# Altium footprint library ic.PcbLib: 106 footprints (part 3 of 7)
Each footprint in its own frame and in the unit in brackets; x right, y up, seen from the top. Pads: shape width x height; smd on the part's side, far side on the other; paste and mask are expansions set on the pad; w line width, h text height; cw(c..) or ccw(c..) is an arc to the next point about the centre after c.
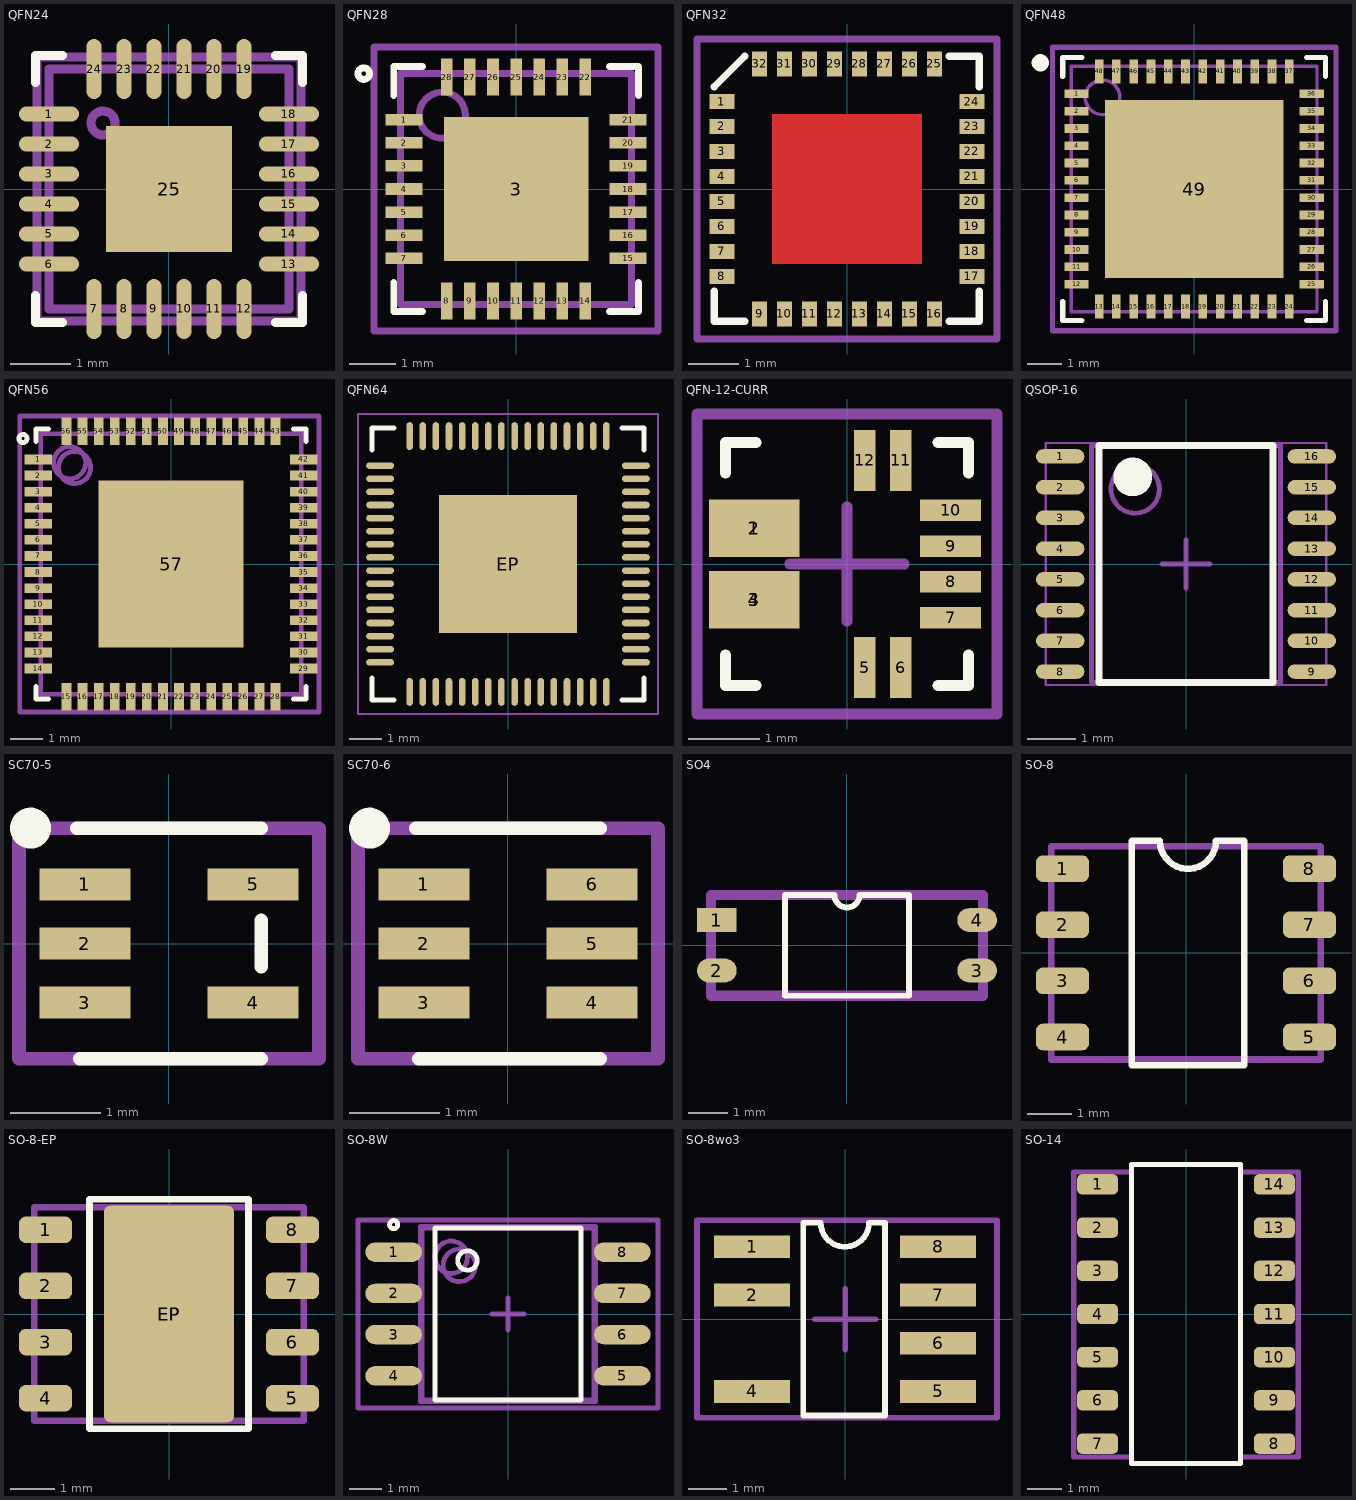
[diagram p2: the footprints below, top view; thin cyan lines are the x and y axes]

## QFN24 [mm] "QFN, 24-Leads, Body 4x4mm, Pitch 0.5mm, Thermal Pad 2.1x2.1mm, IPC Low Density"
height 1
pads (25):
  oval 1x0.25 smd: 1(-2,1.25) 2(-2,0.75) 3(-2,0.25) 4(-2,-0.25) 5(-2,-0.75) 6(-2,-1.25) 13(2,-1.25) 14(2,-0.75) 15(2,-0.25) 16(2,0.25) 17(2,0.75) 18(2,1.25)
  oval 0.25x1 smd: 7(-1.25,-2) 8(-0.75,-2) 9(-0.25,-2) 10(0.25,-2) 11(0.75,-2) 12(1.25,-2) 19(1.25,2) 20(0.75,2) 21(0.25,2) 22(-0.25,2) 23(-0.75,2) 24(-1.25,2)
  rect 2.1x2.1 smd: 25(0,0)
Top Overlay:
  lines w0.15: -2.225,-1.775 -2.225,-2.225 -1.775,-2.225 ; -2.225,1.775 -2.225,2.225 -1.775,2.225 ; 1.775,-2.225 2.225,-2.225 2.225,-1.775 ; 1.775,2.225 2.225,2.225 2.225,1.775
  text "." at -2.845,2.057 h0.1
Top Courtyard:
  lines w0.15: -2,-2 2,-2 2,2 -2,2 -2,-2
Mechanical 29:
  circle w0.15: c-1.1,1.1 r0.2
  lines w0.15: -2.2,-2.2 -2.2,2.2 2.2,2.2 2.2,-2.2 -2.2,-2.2
  text ".Designator" at -2,-0.4 h1
3D body "User Library-LFCSP-24.step": height 0.83, standoff -0.02, extent -2,-2 2,2

## QFN28 [mm] "QFN, 28-Leads, Body 5,00x5,00mm, Pitch 0,50mm, Thermal Pad, IPC Medium Density"
height 1
pads (29):
  rect 0.8x0.25 smd: 1(-2.425,1.5) 2(-2.425,1) 3(-2.425,0.5) 4(-2.425,0) 5(-2.425,-0.5) 6(-2.425,-1) 7(-2.425,-1.5) 15(2.425,-1.5) 16(2.425,-1) 17(2.425,-0.5) 18(2.425,0) 19(2.425,0.5) 20(2.425,1) 21(2.425,1.5)
  rect 3.13x3.13 smd: 3(0,0)
  rect 0.25x0.8 smd: 8(-1.5,-2.425) 9(-1,-2.425) 10(-0.5,-2.425) 11(0,-2.425) 12(0.5,-2.425) 13(1,-2.425) 14(1.5,-2.425) 22(1.5,2.425) 23(1,2.425) 24(0.5,2.425) 25(0,2.425) 26(-0.5,2.425) 27(-1,2.425) 28(-1.5,2.425)
Top Overlay:
  circle w0.15: c-3.3,2.5 r0.125
  lines w0.15: -2.65,-2.025 -2.65,-2.65 -2.025,-2.65 ; -2.65,2.025 -2.65,2.65 -2.025,2.65 ; 2.025,-2.65 2.65,-2.65 2.65,-2.025 ; 2.025,2.65 2.65,2.65 2.65,2.025
Top Solder:
  rectangle: -1.3,1.1 -0.7,1.4
  rectangle: -1.3,0.6 -0.7,0.9
  rectangle: -1.3,0.1 -0.7,0.4
  rectangle: -1.3,-0.4 -0.7,-0.1
  rectangle: -1.3,-0.9 -0.7,-0.6
  rectangle: -1.3,-1.4 -0.7,-1.1
  rectangle: -0.3,-1.4 0.3,-1.1
  rectangle: -0.3,-0.9 0.3,-0.6
  rectangle: -0.3,-0.4 0.3,-0.1
  rectangle: -0.3,0.1 0.3,0.4
  rectangle: -0.3,0.6 0.3,0.9
  rectangle: -0.3,1.1 0.3,1.4
  rectangle: 0.7,-1.4 1.3,-1.1
  rectangle: 0.7,-0.9 1.3,-0.6
  rectangle: 0.7,-0.4 1.3,-0.1
  rectangle: 0.7,0.1 1.3,0.4
  rectangle: 0.7,0.6 1.3,0.9
  rectangle: 0.7,1.1 1.3,1.4
Top Courtyard:
  lines w0.15: -0.5,0 0.5,0 ; 0,-0.5 0,0.5 ; -3.075,-3.075 3.075,-3.075 3.075,3.075 -3.075,3.075 -3.075,-3.075
Mechanical 13:
  circle w0.15: c-1.6,1.6 r0.5
  lines w0.15: -2.5,-2.5 2.5,-2.5 2.5,2.5 -2.5,2.5 -2.5,-2.5
Mechanical 29:
  circle w0.15: c-1.6,1.6 r0.5
  lines w0.15: -2.5,-2.5 -2.5,2.5 2.5,2.5 2.5,-2.5 -2.5,-2.5
  text ".Designator" at -2.2,-0.5 h1
3D body "QFN-28.step": height 1, standoff 0, extent -2.52,-2.52 2.52,2.52

## QFN32 [mm]
pads (32):
  rect 0.5x0.3 smd: 1(-2.5,1.75) 2(-2.5,1.25) 3(-2.5,0.75) 4(-2.5,0.25) 5(-2.5,-0.25) 6(-2.5,-0.75) 7(-2.5,-1.25) 8(-2.5,-1.75) 17(2.5,-1.75) 18(2.5,-1.25) 19(2.5,-0.75) 20(2.5,-0.25) 21(2.5,0.25) 22(2.5,0.75) 23(2.5,1.25) 24(2.5,1.75)
  rect 0.3x0.5 smd: 9(-1.75,-2.5) 10(-1.25,-2.5) 11(-0.75,-2.5) 12(-0.25,-2.5) 13(0.25,-2.5) 14(0.75,-2.5) 15(1.25,-2.5) 16(1.75,-2.5) 25(1.75,2.5) 26(1.25,2.5) 27(0.75,2.5) 28(0.25,2.5) 29(-0.25,2.5) 30(-0.75,2.5) 31(-1.25,2.5) 32(-1.75,2.5)
Top Layer:
  rectangle: -1.5,-1.5 1.5,1.5
Top Overlay:
  lines w0.15: -2.65,-2.05 -2.65,-2.65 -2.05,-2.65 ; -2.65,2.05 -2.05,2.65 ; 2.05,-2.65 2.65,-2.65 2.65,-2.05 ; 2.05,2.65 2.65,2.65 2.65,2.05
  text "." at -2.675,2.65 h0.1
Top Courtyard:
  lines w0.15: -0.8,0 0,0 ; 0,-0.8 0,0 ; 0,0.8 0,0 ; 0.8,0 0,0 ; -3,-3 -3,3 3,3 3,-3 -3,-3

## QFN48 [mm] "QFN, 48-Leads, Body 7,00x7,00mm, Pitch 0,50mm, Thermal Pad 5,15x5,15mm, IPC Medium Density"
height 0.75
pads (49):
  rect 0.7x0.25 smd: 1(-3.4,2.75) 2(-3.4,2.25) 3(-3.4,1.75) 4(-3.4,1.25) 5(-3.4,0.75) 6(-3.4,0.25) 7(-3.4,-0.25) 8(-3.4,-0.75) 9(-3.4,-1.25) 10(-3.4,-1.75) 11(-3.4,-2.25) 12(-3.4,-2.75) 25(3.4,-2.75) 26(3.4,-2.25) 27(3.4,-1.75) 28(3.4,-1.25) 29(3.4,-0.75) 30(3.4,-0.25) 31(3.4,0.25) 32(3.4,0.75) 33(3.4,1.25) 34(3.4,1.75) 35(3.4,2.25) 36(3.4,2.75)
  rect 0.25x0.7 smd: 13(-2.75,-3.4) 14(-2.25,-3.4) 15(-1.75,-3.4) 16(-1.25,-3.4) 17(-0.75,-3.4) 18(-0.25,-3.4) 19(0.25,-3.4) 20(0.75,-3.4) 21(1.25,-3.4) 22(1.75,-3.4) 23(2.25,-3.4) 24(2.75,-3.4) 37(2.75,3.4) 38(2.25,3.4) 39(1.75,3.4) 40(1.25,3.4) 41(0.75,3.4) 42(0.25,3.4) 43(-0.25,3.4) 44(-0.75,3.4) 45(-1.25,3.4) 46(-1.75,3.4) 47(-2.25,3.4) 48(-2.75,3.4)
  rect 5.15x5.15 smd: 49(0,0)
Top Overlay:
  circle w0.25: c-4.45,3.65 r0.125
  lines w0.15: -3.8,-3.25 -3.8,-3.8 -3.25,-3.8 ; -3.8,3.25 -3.8,3.8 -3.25,3.8 ; 3.25,-3.8 3.8,-3.8 3.8,-3.25 ; 3.25,3.8 3.8,3.8 3.8,3.25
Top Courtyard:
  lines w0.15: -0.5,0 0.5,0 ; 0,-0.5 0,0.5 ; -4.1,-4.1 -4.1,4.1 4.1,4.1 4.1,-4.1 -4.1,-4.1
Mechanical 13:
  circle w0.1: c-2.65,2.65 r0.5
  lines w0.1: -3.55,-3.55 -3.55,3.55 3.55,3.55 3.55,-3.55 -3.55,-3.55
3D body "QFN48.step": height 0.75, standoff 0, extent -3.6,-3.6 3.6,3.6

## QFN56 [mm] "QFN, 56-Leads, Body 8,00x8,00mm, Pitch 0,50mm, Thermal Pad 4,50x5,20mm, IPC Medium Density"
height 1
pads (57):
  rect 0.85x0.3 smd: 1(-4.125,3.25) 2(-4.125,2.75) 3(-4.125,2.25) 4(-4.125,1.75) 5(-4.125,1.25) 6(-4.125,0.75) 7(-4.125,0.25) 8(-4.125,-0.25) 9(-4.125,-0.75) 10(-4.125,-1.25) 11(-4.125,-1.75) 12(-4.125,-2.25) 13(-4.125,-2.75) 14(-4.125,-3.25) 29(4.125,-3.25) 30(4.125,-2.75) 31(4.125,-2.25) 32(4.125,-1.75) 33(4.125,-1.25) 34(4.125,-0.75) 35(4.125,-0.25) 36(4.125,0.25) 37(4.125,0.75) 38(4.125,1.25) 39(4.125,1.75) 40(4.125,2.25) 41(4.125,2.75) 42(4.125,3.25)
  rect 0.3x0.85 smd: 15(-3.25,-4.125) 16(-2.75,-4.125) 17(-2.25,-4.125) 18(-1.75,-4.125) 19(-1.25,-4.125) 20(-0.75,-4.125) 21(-0.25,-4.125) 22(0.25,-4.125) 23(0.75,-4.125) 24(1.25,-4.125) 25(1.75,-4.125) 26(2.25,-4.125) 27(2.75,-4.125) 28(3.25,-4.125) 43(3.25,4.125) 44(2.75,4.125) 45(2.25,4.125) 46(1.75,4.125) 47(1.25,4.125) 48(0.75,4.125) 49(0.25,4.125) 50(-0.25,4.125) 51(-0.75,4.125) 52(-1.25,4.125) 53(-1.75,4.125) 54(-2.25,4.125) 55(-2.75,4.125) 56(-3.25,4.125)
  rect 4.5x5.2 smd: 57(0,0)
Top Overlay:
  circle w0.15: c-4.6,3.9 r0.125
  lines w0.15: -4.2,-3.8 -4.2,-4.2 -3.8,-4.2 ; -4.2,3.8 -4.2,4.2 -3.8,4.2 ; 3.8,-4.2 4.2,-4.2 4.2,-3.8 ; 3.8,4.2 4.2,4.2 4.2,3.8
Top Courtyard:
  lines w0.15: -0.5,0 0.5,0 ; -4.7,-4.6 4.6,-4.6 4.6,4.6 -4.7,4.6 -4.7,-4.6
Mechanical 13:
  circle w0.15: c-3.15,3.15 r0.5
Mechanical 29:
  circle w0.15: c-3,3 r0.5
  lines w0.15: -4.05,-4.05 4.05,-4.05 4.05,4.05 -4.05,4.05 -4.05,-4.05
  text ".Designator" at -3.5,-0.4 h1

## QFN64 [mm] "QFN, 64-Leads, Body 8,00x8,00mm, Pitch 0,40mm, Thermal Pad 4,20x4,20mm, IPC Medium Density"
height 0.85
pads (65):
  oval 0.85x0.2 smd: 1(-3.9,3) 2(-3.9,2.6) 3(-3.9,2.2) 4(-3.9,1.8) 5(-3.9,1.4) 6(-3.9,1) 7(-3.9,0.6) 8(-3.9,0.2) 9(-3.9,-0.2) 10(-3.9,-0.6) 11(-3.9,-1) 12(-3.9,-1.4) 13(-3.9,-1.8) 14(-3.9,-2.2) 15(-3.9,-2.6) 16(-3.9,-3) 33(3.9,-3) 34(3.9,-2.6) 35(3.9,-2.2) 36(3.9,-1.8) 37(3.9,-1.4) 38(3.9,-1) 39(3.9,-0.6) 40(3.9,-0.2) 41(3.9,0.2) 42(3.9,0.6) 43(3.9,1) 44(3.9,1.4) 45(3.9,1.8) 46(3.9,2.2) 47(3.9,2.6) 48(3.9,3)
  oval 0.2x0.85 smd: 17(-3,-3.9) 18(-2.6,-3.9) 19(-2.2,-3.9) 20(-1.8,-3.9) 21(-1.4,-3.9) 22(-1,-3.9) 23(-0.6,-3.9) 24(-0.2,-3.9) 25(0.2,-3.9) 26(0.6,-3.9) 27(1,-3.9) 28(1.4,-3.9) 29(1.8,-3.9) 30(2.2,-3.9) 31(2.6,-3.9) 32(3,-3.9) 49(3,3.9) 50(2.6,3.9) 51(2.2,3.9) 52(1.8,3.9) 53(1.4,3.9) 54(1,3.9) 55(0.6,3.9) 56(0.2,3.9) 57(-0.2,3.9) 58(-0.6,3.9) 59(-1,3.9) 60(-1.4,3.9) 61(-1.8,3.9) 62(-2.2,3.9) 63(-2.6,3.9) 64(-3,3.9)
  rect 4.2x4.2 smd: EP(0,0)
Top Overlay:
  lines w0.15: -4.15,-3.475 -4.15,-4.15 -3.475,-4.15 ; -4.15,3.475 -4.15,4.15 -3.475,4.15 ; 3.475,-4.15 4.15,-4.15 4.15,-3.475 ; 3.475,4.15 4.15,4.15 4.15,3.475
  text "." at -4.9,3.9 h0.1
Top Courtyard:
  lines w0.05: -4.575,-4.575 4.575,-4.575 4.575,4.575 -4.575,4.575 -4.575,-4.575
  lines w0.1: -0.5,0 0.5,0 ; 0,-0.5 0,0.5
3D body "QFN64.step": height 0.85, standoff 0, extent -4.01,-4.01 4.01,4.01

## QFN-12-CURR [mm] "QFN, 12-Contact  With Fused Sensed Current Loop"
height 0.9
pads (12):
  rect 1.27x0.8 smd: 1(-1.3,0.5) 2(-1.3,0.5) 3(-1.3,-0.5) 4(-1.3,-0.5)
  rect 0.3x0.85 smd: 5(0.25,-1.45) 6(0.75,-1.45) 11(0.75,1.45) 12(0.25,1.45)
  rect 0.85x0.3 smd: 7(1.45,-0.75) 8(1.45,-0.25) 9(1.45,0.25) 10(1.45,0.75)
Top Overlay:
  lines w0.15: -1.7,-1.275 -1.7,-1.7 -1.275,-1.7 ; -1.7,1.275 -1.7,1.7 -1.275,1.7 ; 1.275,-1.7 1.7,-1.7 1.7,-1.275 ; 1.275,1.7 1.7,1.7 1.7,1.275
  text "." at -2.2,1.575 h0.1
Top Courtyard:
  lines w0.15: -0.8,0 0,0 ; 0,-0.8 0,0 ; 0,0.8 0,0 ; 0.8,0 0,0 ; -2.1,-2.1 2.1,-2.1 2.1,2.1 -2.1,2.1 -2.1,-2.1
3D body "QFN16.STEP": height 0.89, standoff 0, extent -1.55,-1.55 1.55,1.55

## QSOP-16 [mm] "QSOP, 16-Leads, Body 4,89x3,90mm, Pitch 0,64mm, IPC High Density"
height 1.75
pads (16):
  oval 1x0.3 smd: 1(-2.6,2.222) 2(-2.6,1.587) 3(-2.6,0.953) 4(-2.6,0.318) 5(-2.6,-0.318) 6(-2.6,-0.953) 7(-2.6,-1.587) 8(-2.6,-2.222) 9(2.6,-2.222) 10(2.6,-1.587) 11(2.6,-0.953) 12(2.6,-0.318) 13(2.6,0.318) 14(2.6,0.953) 15(2.6,1.587) 16(2.6,2.222)
Top Overlay:
  circle w0.4: c-1.1,1.8 r0.2
  lines w0.15: -1.8,-2.45 -1.8,2.45 1.8,2.45 1.8,-2.45 -1.8,-2.45
  text "." at -2.655,2.859 h0.1
Top Courtyard:
  lines w0.05: -2.9,-2.5 -2.9,2.5 2.9,2.5 2.9,-2.5 -2.9,-2.5
  lines w0.1: -0.5,0 0.5,0 ; 0,-0.5 0,0.5
Mechanical 13:
  circle w0.1: c-1.05,1.55 r0.5
  lines w0.1: -1.95,-2.45 -1.95,2.45 1.95,2.45 1.95,-2.45 -1.95,-2.45
3D body: height 1.75, standoff 0.2, extent 0,0 0,0
3D body: height 1, standoff 0.2, extent -2,-2.5 2,2.5

## SC70-5 [mm] "SOTFL, 5-Leads, Body 2,00x2,10mm, Pitch 1,30mm, IPC Medium Density"
height 1.1
pads (5):
  rect 1x0.35 smd: 1(-0.925,0.65) 2(-0.925,0) 3(-0.925,-0.65) 4(0.925,-0.65) 5(0.925,0.65)
Top Overlay:
  circle w0.25: c-1.524,1.27 r0.1
  lines w0.15: -1.016,1.27 1.016,1.27 ; -0.984,-1.27 1.016,-1.27 ; 1.016,-0.254 1.016,0.254
Top Courtyard:
  lines w0.15: -1.651,-1.27 1.651,-1.27 1.651,1.27 -1.651,1.27 -1.651,-1.27
3D body: height 1.1, standoff 0, extent -1,-1.143 1,1.143

## SC70-6 [mm] "SOTFL, 6-Leads, Body 2,00x2,10mm, Pitch 1,30mm, IPC Medium Density"
height 1.1
pads (6):
  rect 1x0.35 smd: 1(-0.925,0.65) 2(-0.925,0) 3(-0.925,-0.65) 4(0.925,-0.65) 5(0.925,0) 6(0.925,0.65)
Top Overlay:
  circle w0.25: c-1.524,1.27 r0.1
  lines w0.15: -1.016,1.27 1.016,1.27 ; -0.984,-1.27 1.016,-1.27
Top Courtyard:
  lines w0.15: -1.651,-1.27 -1.651,1.27 1.651,1.27 1.651,-1.27 -1.651,-1.27
3D body: height 1.1, standoff 0, extent -1,-1.143 1,1.143

## SO4 [mm]
pads (4):
  rect 1x0.6 smd: 1(-3.277,0.635)
  oval 1x0.6 smd: 2(-3.277,-0.635) 3(3.277,-0.635) 4(3.277,0.635)
Top Overlay:
  lines w0.15: -1.565,-1.27 -1.565,1.27 -0.318,1.27 ccw(c0,1.27) 0.318,1.27 1.565,1.27 1.565,-1.27 -1.565,-1.27
  text "." at -3.15,1.435 h0.1
Top Courtyard:
  lines w0.254: -3.429,-1.27 3.429,-1.27 3.429,1.27 -3.429,1.27 -3.429,-1.27
3D body "PC3H7.STEP": height 2.1, standoff 0.05, extent -3.5,-1.3 3.5,1.3

## SO-8 [mm]
pads (8):
  rrect50% 1.2x0.6 smd: 1(-2.794,1.905) 2(-2.794,0.635) 3(-2.794,-0.635) 4(-2.794,-1.905) 5(2.794,-1.905) 6(2.794,-0.635) 7(2.794,0.635) 8(2.794,1.905)
Top Overlay:
  lines w0.15: -1.226,-2.545 -1.226,2.535 -0.591,2.535 ccw(c0.044,2.535) 0.679,2.535 1.314,2.535 1.314,-2.545 -1.226,-2.545
  text "." at -2.7,2.8 h0.1
Top Courtyard:
  lines w0.15: -3.048,-2.413 -3.048,2.413 3.048,2.413 3.048,-2.413 -3.048,-2.413
3D body "User Library-so8-4.STEP": height 1.76, standoff 0, extent -3.068,-2.445 3.068,2.445

## SO-8-EP [mm]
pads (10):
  rrect50% 1.2x0.6 smd: 1(-2.794,1.905) 2(-2.794,0.635) 3(-2.794,-0.635) 4(-2.794,-1.905) 5(2.794,-1.905) 6(2.794,-0.635) 7(2.794,0.635) 8(2.794,1.905)
  rrect10% 2.95x4.9 smd mask+0.102: EP(0,0)
  rrect10% 2.6x3.1 smd: EP(0,0)
Top Overlay:
  lines w0.15: 1.8,2.596 -1.8,2.596 -1.8,-2.6 1.8,-2.6 1.8,2.6
  text "." at -2.7,2.8 h0.1
Top Courtyard:
  lines w0.15: -3.048,-2.413 3.048,-2.413 3.048,2.413 -3.048,2.413 -3.048,-2.413
3D body "User Library-so8-4.STEP": height 1.76, standoff 0, extent -3.068,-2.445 3.068,2.445

## SO-8W [mm] "SOIC, 8-Leads, Body 5,28x5,28mm, Pitch 1,27mm, IPC Medium Density"
height 1.91
pads (8):
  oval 1.75x0.6 smd: 1(-3.525,1.905) 2(-3.525,0.635) 3(-3.525,-0.635) 4(-3.525,-1.905) 5(3.525,-1.905) 6(3.525,-0.635) 7(3.525,0.635) 8(3.525,1.905)
Top Overlay:
  circle w0.15: c-3.525,2.755 r0.125
  circle w0.15: c-1.25,1.65 r0.3
  lines w0.15: -2.25,-2.65 -2.25,2.65 2.25,2.65 2.25,-2.65 -2.25,-2.65
Top Courtyard:
  lines w0.15: -0.5,0 0.5,0 ; 0,-0.5 0,0.5 ; -4.625,-2.9 -4.625,2.9 4.625,2.9 4.625,-2.9 -4.625,-2.9
Mechanical 13:
  circle w0.15: c-1.75,1.75 r0.5
  lines w0.15: -2.65,-2.65 -2.65,2.65 2.65,2.65 2.65,-2.65 -2.65,-2.65
Mechanical 29:
  circle w0.15: c-1.5,1.5 r0.5
  lines w0.15: -2.7,-2.1 -3.8,-2.1 -3.8,-1.8 -2.7,-1.8 ; -2.7,-0.8 -3.8,-0.8 -3.8,-0.5 -2.7,-0.5 ; -2.7,0.5 -3.8,0.5 -3.8,0.8 -2.7,0.8 ; -2.7,1.8 -3.8,1.8 -3.8,2.1 -2.7,2.1 ; 2.7,-2.1 3.8,-2.1 3.8,-1.8 2.7,-1.8 ; 2.7,-0.8 3.8,-0.8 3.8,-0.5 2.7,-0.5 ; 2.7,0.5 3.8,0.5 3.8,0.8 2.7,0.8 ; 2.7,1.8 3.8,1.8 3.8,2.1 2.7,2.1 ; -2.7,-2.7 2.7,-2.7 2.7,2.7 -2.7,2.7 -2.7,-2.7
  text ".Designator" at -2.5,-0.5 h1
3D body: height 1.91, standoff 0.1, extent -2.65,-2.65 2.65,2.65

## SO-8wo3 [mm]
pads (7):
  rect 2x0.6 smd: 1(-2.45,1.905) 2(-2.45,0.635) 4(-2.45,-1.905) 5(2.45,-1.905) 6(2.45,-0.635) 7(2.45,0.635) 8(2.45,1.905)
Top Overlay:
  lines w0.15: -1.1,-2.54 1.05,-2.54 1.05,2.54 0.629,2.54 cw(c-0.006,2.54) -0.641,2.54 -1.1,2.54 -1.1,-2.54
  text "." at -2.5,2.6 h0.1
Top Courtyard:
  lines w0.15: -0.8,0 0,0 ; 0,-0.8 0,0 ; 0,0.8 0,0 ; 0.8,0 0,0 ; -3.9,-2.6 -3.9,2.6 4,2.6 4,-2.6 -3.9,-2.6
3D body "User Library-so8-4.STEP": height 1.76, standoff 0, extent -3.099,-2.445 3.038,2.445

## SO-14 [mm] "SOIC, 14-Leads, Body 8,65x3,90mm, Pitch 1,27mm, IPC Medium Density"
height 1.75
pads (14):
  rrect50% 1.2x0.6 smd: 1(-2.6,3.81) 2(-2.6,2.54) 3(-2.6,1.27) 4(-2.6,0) 5(-2.6,-1.27) 6(-2.6,-2.54) 7(-2.6,-3.81) 8(2.6,-3.81) 9(2.6,-2.54) 10(2.6,-1.27) 11(2.6,0) 12(2.6,1.27) 13(2.6,2.54) 14(2.6,3.81)
Top Overlay:
  lines w0.15: -1.6,-4.4 -1.6,4.4 1.6,4.4 1.6,-4.4 -1.6,-4.4
  text "." at -3.2,4.7 h0.1
Top Courtyard:
  lines w0.15: -3.3,-4.2 -1.6,-4.2 -1.6,-4.4 1.6,-4.4 1.6,-4.2 3.3,-4.2 3.3,4.173 1.6,4.173 1.6,4.4 -1.6,4.4 -1.6,4.18 -3.3,4.18 -3.3,-4.2
3D body "SO-14N.step": height 1.75, standoff 0, extent -3,-4.4 3,4.4